# Altium footprint library xhayqua.PcbLib: 185 footprints (part 2 of 12)
Each footprint in its own frame and in the unit in brackets; x right, y up, seen from the top. Pads: shape width x height; smd on the part's side, far side on the other; paste and mask are expansions set on the pad; w line width, h text height; cw(c..) or ccw(c..) is an arc to the next point about the centre after c.
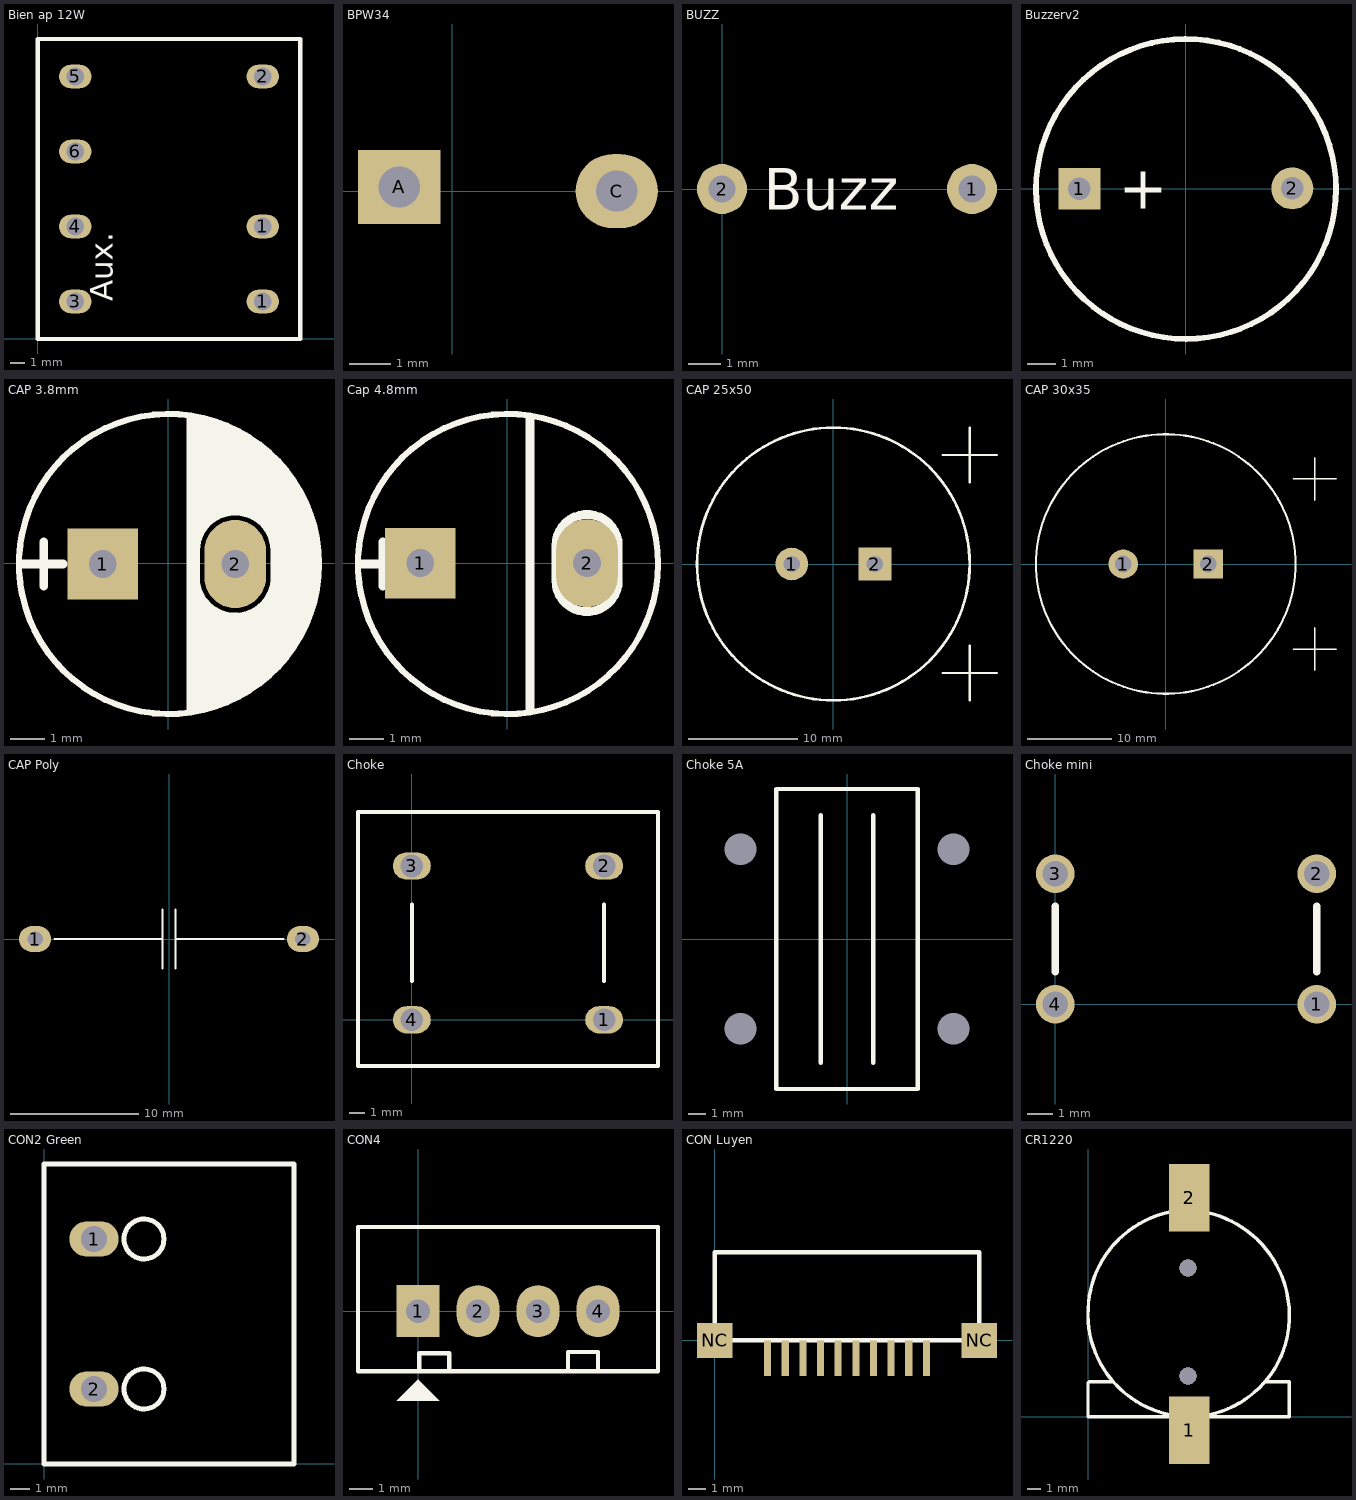
[diagram p1: the footprints below, top view; thin cyan lines are the x and y axes]

## Bien ap 12W [mm]
pads (7):
  oval 2.2x1.6 hole 1.2: 1(15.24,2.54) 1(15.24,7.62) 2(15.24,17.78) 3(2.54,2.54) 4(2.54,7.62) 5(2.54,17.78) 6(2.54,12.7)
Top Overlay:
  lines w0.3: 0,0 0,20.32 17.78,20.32 17.78,0 0,0
  text ".Sec" at 15.24,10.16 h1.52
  text "Aux." at 5.08,2.54 h1.52
  text ".Pri" at 5.08,12.7 h1.52
3D body "User Library-Phone Line Transformer.STEP": height 16, standoff -3, extent 0.14,0.16 17.64,20.16

## BPW34 [mm]
pads (2):
  rect 2x1.8 hole 1: A(-1.285,0.103)
  oval 2x1.8 hole 1: C(4,0)
3D body "bpw34-1.X_T": height 3.09, standoff -2.11, extent -1.285,-2.097 4.115,2.303

## BUZZ [mil]
pads (2):
  round 60 hole 32: 1(300,0) 2(0,0)
Top Overlay:
  text "Buzz" at 50,-25 h50

## Buzzerv2 [mm]
pads (2):
  rect 1.5x1.5 hole 0.8: 1(-3.81,0)
  round 1.5 hole 0.8: 2(3.81,0.013)
Top Overlay:
  lines w0.203: 3.914,3.67 ccw(c0.006,-0.008) 3.95,3.632
  text "+" at -2.4,-0.711 h1.52
3D body "User Library-Buzzer WST-1203UX.step": height 4.5, standoff -9.65, extent -6.025,-6 9.429,6

## CAP 3.8mm [mil] "16V 470uF"
height 787.4
pads (2):
  rect 80x80 hole 31.5: 1(-74,-1)
  oval 70x100 hole 31.5: 2(76,-1)
Top Overlay:
  circle w7: c1,-1 r170
  region: 26,24 61,59 88.93,59 90.6,58.92 93.88,58.26 96.98,56.98 99.76,55.12 101,54 107.46,47.54 108.26,46.66 109.57,44.69 110.48,42.5 110.94,40.18 111,39 116,34 117.12,32.76 118.98,29.98 120.26,26.88 120.92,23.6 121,21.93 121,-28.93 120.92,-30.6 120.26,-33.88 118.98,-36.98 117.12,-39.76 116,-41 104.54,-52.46 103.66,-53.26 101.69,-54.57 99.5,-55.48 97.18,-55.94 96,-56 94.76,-57.12 91.98,-58.98 88.88,-60.26 85.6,-60.92 83.93,-61 70.14,-61 66.8,-60.84 60.23,-59.53 54.05,-56.97 48.48,-53.25 46,-51 34.54,-39.54 33.74,-38.66 32.43,-36.69 31.52,-34.5 31.06,-32.18 31,-31 26,-31 26,-171 81,-151 121,-121 151,-81 171,-21 171,19 156,69 126,114 91,144 46,164 26,169
  lines w10: -164,-1 -119,-1 ; -141,-26 -141,24 ; 26,-166 26,164 ; 26,24 31,24 ; 31,-21 31,29 ; 31,-11 ccw(c76,-16) 71,-61 ccw(c76,-16) 121,-21 121,14 ccw(c76,14) 76,59 ccw(c76,14) 31,14
3D body "User Library-CAP 8X11_5.STEP": height 445.89, standoff -754.41, extent -158.96,-158.48 156,156.48

## Cap 4.8mm [mm] "25V 1000uF 4.8mm/10x20mm"
height 20
pads (2):
  rect 2.032x2.032 hole 0.8: 1(-2.5,0)
  oval 1.778x2.54 hole 0.8: 2(2.3,0)
Top Overlay:
  circle w0.178: c0.025,-0.025 r4.318
  lines w0.254: -4.166,-0.025 -3.023,-0.025 ; -3.581,-0.66 -3.581,0.61 ; 0.66,-4.216 0.66,4.166 ; 1.4,-0.5 ccw(c2.3,-0.5) 3.2,-0.5 3.2,0.5 ccw(c2.3,0.5) 1.4,0.5 1.4,-0.5
3D body "User Library-CAP 8X11_5.STEP": height 11.33, standoff -19.16, extent -4.038,-4.025 3.962,3.975

## CAP 25x50 [mm]
pads (2):
  round 3 hole 1.5: 1(-3.81,0)
  rect 3x3 hole 1.5: 2(3.81,0)
Top Overlay:
  circle w0.254: c0,0 r12.5
  lines w0.203: 10,-10 15,-10 ; 10,10 15,10 ; 12.5,-12.5 12.5,-7.5 ; 12.5,7.5 12.5,12.5
3D body "User Library-Cap 25x50.STEP": height 50.01, standoff -18.99, extent -12.5,-12.5 12.5,12.5

## CAP 30x35 [mm]
pads (2):
  round 3.5 hole 2: 1(-5.08,0)
  rect 3.5x3.5 hole 2: 2(5.08,0)
Top Overlay:
  circle w0.254: c0,0 r15.494
  lines w0.203: 15.24,-10.16 20.32,-10.16 ; 15.24,10.16 20.32,10.16 ; 17.78,-12.7 17.78,-7.62 ; 17.78,7.62 17.78,12.7
3D body "User Library-Assy_CE_R400_D1200_H1450.STEP": height 37.83, standoff -5.89, extent -15.24,-15.367 15.24,15.113

## CAP Poly [mm]
pads (2):
  oval 2.5x2 hole 1.2: 1(-10.414,0) 2(10.414,0)
Top Overlay:
  lines w0.15: -8.89,0 -0.508,0 ; -0.508,-2.286 -0.508,2.286 ; 0.508,-2.286 0.508,2.286 ; 0.508,0 8.89,0
3D body "User Library-cap-21.step": height 14, standoff -3, extent -11,-2.5 11,2.5

## Choke [mm] "Choke"
pads (4):
  oval 2.5x1.8 hole 1.5: 1(12.7,0) 2(12.7,10.16) 3(0,10.16) 4(0,0)
Top Overlay:
  lines w0.254: 0,2.54 0,7.62 ; 12.7,2.54 12.7,7.62 ; -3.556,-3.048 16.256,-3.048 16.256,13.716 -3.556,13.716 -3.556,-3.048
3D body "Coilcraft-BU10.STEP": height 22.5, standoff -4.5, extent -3.065,-2.921 15.875,13.179

## Choke 5A [mm]
pads (4):
  rrect50% 0x0 / inner rrect50% 0x0 / far side rrect50% 3x3.5 hole 1.8: 1(6.032,-5.08) 2(6.032,5.08) 3(-6.032,5.08) 4(-6.032,-5.08)
Top Overlay:
  lines w0.254: -1.5,-7 -1.5,7 ; 1.5,-7 1.5,7 ; -4,-8.5 -4,8.5 4,8.5 4,-8.5 -4,-8.5
3D body "User Library-UU16.step": height 25.56, standoff -3.79, extent -11.112,-9.375 11.122,9.325

## Choke mini [mm]
pads (4):
  round 1.5 hole 1: 1(10.16,0) 2(10.16,5.08) 3(0,5.08) 4(0,0)
Top Overlay:
  lines w0.3: 0,1.27 0,3.81 ; 10.16,1.27 10.16,3.81

## CON2 Green [mm]
pads (2):
  oval 2.5x1.8 hole 1.3: 1(2.54,11.405) 2(2.54,3.785)
Top Overlay:
  circle w0.254: c5.08,3.785 r1.016
  circle w0.254: c5.08,11.405 r1.016
  lines w0.254: 0,-0.025 0,15.215 12.7,15.215 12.7,-0.025 0,-0.025

## CON4 [mm]
pads (4):
  rect 1.8x2.2 hole 1: 1(0,0)
  oval 1.8x2.2 hole 1: 2(2.54,0) 3(5.08,0) 4(7.62,0)
Top Overlay:
  region: -0.902,-3.797 0.902,-3.797 0.013,-2.908 0.013,-2.883
  lines w0.178: 0.051,-2.54 0.051,-1.778 1.321,-1.778 1.321,-2.54 ; 6.35,-2.489 6.35,-1.727 7.62,-1.727 7.62,-2.489 ; -2.54,-2.54 10.16,-2.54 10.16,0 10.16,3.556 -2.54,3.556 -2.54,-2.54
3D body "User Library-HEADER,JST,BxB-XH-A.STEP": height 7, standoff -3.4, extent -2.286,-2.286 10.114,3.464

## CON Luyen [mm]
pads (12):
  rect 0.4x2 smd: 1(3,-1) 2(4,-1) 3(5,-1) 4(6,-1) 5(7,-1) 6(8,-1) 7(9,-1) 8(10,-1) 9(11,-1) 10(12,-1)
  rect 2x2 smd: NC(0,0) NC(15,0)
Top Overlay:
  lines w0.254: 0,0 15,0 15,5 0,5 0,0

## CR1220 [mm]
pads (2):
  rect 3x5 smd: 1(7.5,-1) 2(7.5,16.2)
via 7.4,11 diameter 1.27 hole 1.27
via 7.4,3 diameter 1.27 hole 1.27
Top Overlay:
  lines w0.254: 0,2.5 0,0 14.9,0 ; 0.1,2.6 1.8,2.6 ; 7,15.3 cw(c7.1,7.5) 14.9,7.6 cw(c7.45,7.45) 7.6,0 cw(c7.55,7.55) 0,7.5 cw(c7.6,7.7) 7.4,15.3 ; 13.1,2.6 14.9,2.6 14.9,0 ; 14.9,0.1 14.9,2.5 ; 14.9,0.2 14.9,0
3D body "User Library-Battery Holder for CR1220 SMD.STEP": height 4.23, standoff -0.52, extent -0.017,-2.036 14.732,16.764